# Altium footprint library hallglib.PcbLib: 88 footprints (part 4 of 6)
Each footprint in its own frame and in the unit in brackets; x right, y up, seen from the top. Pads: shape width x height; smd on the part's side, far side on the other; paste and mask are expansions set on the pad; w line width, h text height; cw(c..) or ccw(c..) is an arc to the next point about the centre after c.
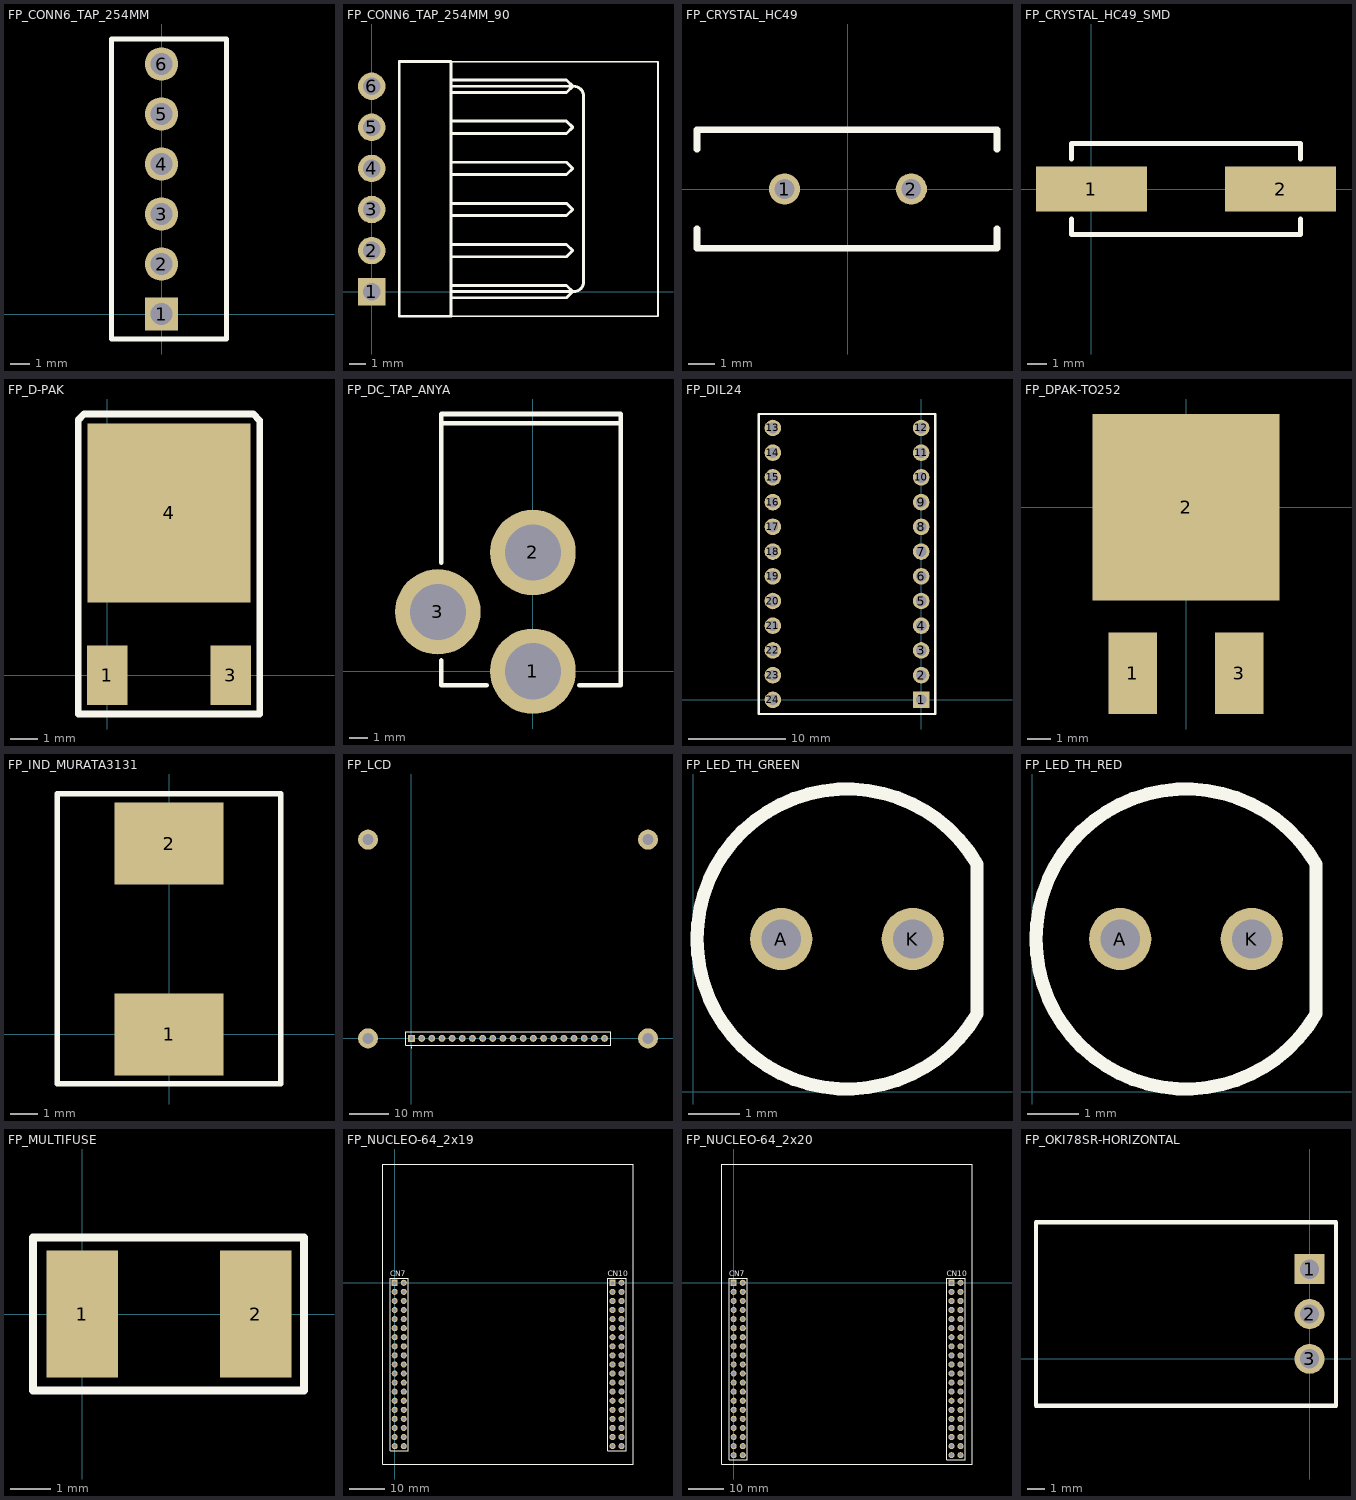
[diagram p3: the footprints below, top view; thin cyan lines are the x and y axes]

## FP_CONN6_TAP_254MM [mm] "álló hat pólusú tápcsatlakozó 2.54mm"
height 6.3
pads (6):
  rect 1.7x1.7 hole 1.1: 1(0,0)
  round 1.7 hole 1.1: 2(0,2.54) 3(0,5.08) 4(0,7.62) 5(0,10.16) 6(0,12.7)
Top Overlay:
  lines w0.254: -2.54,-1.27 3.302,-1.27 3.302,13.97 -2.54,13.97 -2.54,-1.27
3D body "Cvilux_CI31_6.step": height 11.56, standoff -3.24, extent -2.521,-1.27 3.279,13.97

## FP_CONN6_TAP_254MM_90 [mm] "fekvő hat pólusú tápcsatlakozó 2.54mm"
height 6.3
pads (6):
  rect 1.7x1.7 hole 1.1: 1(0,0)
  round 1.7 hole 1.1: 2(0,2.54) 3(0,5.08) 4(0,7.62) 5(0,10.16) 6(0,12.7)
Top Overlay:
  lines w0.102: 4.9,-1.53 17.7,-1.53 17.7,14.224 4.9,14.224
  lines w0.178: 4.9,0 12.5,0 ccw(c12.5,0.6) 13.1,0.6 13.1,12.065 ; 4.9,12.7 12.5,12.7 cw(c12.5,12.1) 13.1,12.1 ; 4.934,-0.381 12.046,-0.381 12.427,0 12.046,0.381 4.934,0.381 ; 4.934,2.159 12.046,2.159 12.427,2.54 12.046,2.921 4.934,2.921 ; 4.934,4.699 12.046,4.699 12.427,5.08 12.046,5.461 4.934,5.461 ; 4.934,7.239 12.046,7.239 12.427,7.62 12.046,8.001 4.934,8.001 ; 4.934,9.779 12.046,9.779 12.427,10.16 12.046,10.541 4.934,10.541 ; 4.934,12.319 12.046,12.319 12.427,12.7 12.046,13.081 4.934,13.081 ; 1.7,-1.524 1.7,14.224 4.9,14.224 4.9,-1.524 1.7,-1.524
3D body "254_TAP_4P.STEP": height 5.8, standoff -3.4, extent -0.343,3.785 13.482,13.945
3D body "254_TAP_4P.STEP": height 5.8, standoff -3.4, extent -0.343,-1.295 13.482,8.865

## FP_CRYSTAL_HC49 [mm] "HC49"
height 3.7
pads (2):
  round 1.2 hole 0.762: 1(-2.44,0) 2(2.44,0)
Top Overlay:
  lines w0.254: -5.816,-1.524 -5.816,-2.286 5.741,-2.286 5.741,-1.524 ; -5.816,1.524 -5.816,2.286 5.741,2.286 5.741,1.524
3D body "SW3dPS-HP49US.STEP": height 3.5, standoff -4, extent -5.675,-2.35 5.675,2.3

## FP_CRYSTAL_HC49_SMD [mil] "HC49/SMD"
height 118.11
pads (2):
  rect 220x90 smd: 1(0,0) 2(375,0)
Top Overlay:
  lines w10: -40,-60 -40,-90 415,-90 415,-60 ; -40,60 -40,90 415,90 415,60
3D body: height 5, standoff 0, extent 415,-20 432,20
3D body: height 5, standoff 0, extent -57,-20 -40,20
3D body: height 10, standoff 0, extent -40,-90 415,90
3D body: height 130, standoff 10, extent -25,-80 400,80

## FP_D-PAK [mm] "D-Pak (TO-252-AA)"
height 2.39
pads (3):
  rect 1.5x2.2 smd: 1(0,0) 3(4.572,0)
  rect 6x6.6 smd: 4(2.286,6)
Top Overlay:
  lines w0.254: -1.064,-1.425 5.636,-1.425 5.636,9.414 5.4,9.65 -0.85,9.65 -1.064,9.436 -1.064,-1.425
3D body "D-PAK_TO252AA.STEP": height 2.32, standoff 0.02, extent -0.992,-0.786 5.588,8.914

## FP_DC_TAP_ANYA [mil] "DC HEBA25 TÁPFESZÜLTSÉG ALJZAT ZÁRT, NYÁKBA 90°"
height 421.26
pads (3):
  round 180 hole 118: 1(0,0) 2(0,250) 3(-200,125)
Top Overlay:
  lines w10: -192.91,22.64 -192.91,-29.53 -97.44,-29.53 ; -192.91,228.35 -192.91,541.34 185.04,541.34 185.04,-29.53 97.44,-29.53 ; -192.91,522.13 185.04,522.13
3D body "kycon kld-0202-a.step": height 440, standoff -141.73, extent -190.39,-30.63 182.52,539.37

## FP_DIL24 [mm] "DIL24"
height 8.54
pads (24):
  rect 1.7x1.7 hole 1.1: 1(0,0)
  round 1.7 hole 1.1: 2(0,2.54) 3(0,5.08) 4(0,7.62) 5(0,10.16) 6(0,12.7) 7(0,15.24) 8(0,17.78) 9(0,20.32) 10(0,22.86) 11(0,25.4) 12(0,27.94) 13(-15.24,27.94) 14(-15.24,25.4) 15(-15.24,22.86) 16(-15.24,20.32) 17(-15.24,17.78) 18(-15.24,15.24) 19(-15.24,12.7) 20(-15.24,10.16) 21(-15.24,7.62) 22(-15.24,5.08) 23(-15.24,2.54) 24(-15.24,0)
Top Overlay:
  lines w0.254: -16.7,-1.45 1.45,-1.45 1.45,29.375 -16.7,29.375 -16.7,-1.45
3D body: height 2.54, standoff 0, extent -16.52,3.81 -13.98,8.89
3D body: height 0, standoff -3, extent -15.58,4.75 -14.92,5.41
3D body: height 0, standoff -3, extent -15.58,7.29 -14.92,7.95
3D body: height 0, standoff -3, extent -15.58,2.21 -14.92,2.87
3D body: height 0, standoff -3, extent -15.58,-0.33 -14.92,0.33
3D body: height 2.54, standoff 0, extent -16.52,-1.27 -13.98,3.81
3D body: height 0, standoff -3, extent -15.58,12.385 -14.92,13.045
3D body: height 0, standoff -3, extent -15.58,9.845 -14.92,10.505
3D body: height 2.54, standoff 0, extent -16.52,8.905 -13.98,13.985
3D body: height 0, standoff -3, extent -15.58,17.46 -14.92,18.12
3D body: height 0, standoff -3, extent -15.58,14.92 -14.92,15.58
3D body: height 2.54, standoff 0, extent -16.52,13.98 -13.98,19.06
3D body: height 0, standoff -3, extent -15.58,22.535 -14.92,23.195
3D body: height 0, standoff -3, extent -15.58,19.995 -14.92,20.655
3D body: height 2.54, standoff 0, extent -16.52,19.055 -13.98,24.135
3D body: height 0, standoff -3, extent -15.58,27.61 -14.92,28.27
3D body: height 0, standoff -3, extent -15.58,25.07 -14.92,25.73
3D body: height 2.54, standoff 0, extent -16.52,24.13 -13.98,29.21
3D body: height 2.54, standoff 0, extent -1.27,24.13 1.27,29.21
3D body: height 0, standoff -3, extent -0.33,25.07 0.33,25.73
3D body: height 0, standoff -3, extent -0.33,27.61 0.33,28.27
3D body: height 2.54, standoff 0, extent -1.27,19.055 1.27,24.135
3D body: height 0, standoff -3, extent -0.33,19.995 0.33,20.655
3D body: height 0, standoff -3, extent -0.33,22.535 0.33,23.195
3D body: height 2.54, standoff 0, extent -1.27,13.98 1.27,19.06
3D body: height 0, standoff -3, extent -0.33,14.92 0.33,15.58
3D body: height 0, standoff -3, extent -0.33,17.46 0.33,18.12
3D body: height 2.54, standoff 0, extent -1.27,8.905 1.27,13.985
3D body: height 0, standoff -3, extent -0.33,9.845 0.33,10.505
3D body: height 0, standoff -3, extent -0.33,12.385 0.33,13.045
3D body: height 2.54, standoff 0, extent -1.27,-1.27 1.27,3.81
3D body: height 0, standoff -3, extent -0.33,-0.33 0.33,0.33
3D body: height 0, standoff -3, extent -0.33,2.21 0.33,2.87
3D body: height 0, standoff -3, extent -0.33,7.29 0.33,7.95
3D body: height 0, standoff -3, extent -0.33,4.75 0.33,5.41
3D body: height 2.54, standoff 0, extent -1.27,3.81 1.27,8.89
3D body: height 4, standoff 2.54, extent -16.525,-1.275 1.275,29.2
3D body: height 4.86, standoff 4, extent -9.125,4.25 -6.125,6.75

## FP_DPAK-TO252 [mm] "D-PAK Package"
height 2.18
pads (3):
  rect 2.08x3.5 smd: 1(-2.286,-7.112) 3(2.286,-7.112)
  rect 8x8 smd: 2(0,0)
3D body "DPAK_TO-252AA.STEP": height 2.37, standoff -0.03, extent -3.367,-7.112 3.367,2.988

## FP_IND_MURATA3131 [mm] "Murata Chip Inductor LQH88P Series (3131 Size)"
height 4
pads (2):
  rect 4x3 smd: 1(0,0) 2(0,7)
Top Overlay:
  lines w0.2: -4.1,-1.8 -4.1,8.825 4.1,8.825 4.1,-1.8 -4.1,-1.8
3D body: height 1, standoff 0, extent -4,-0.5 4,7.6
3D body: height 3.8, standoff 2.8, extent -4,-0.5 4,7.6
3D body: height 2.8, standoff 1, extent -3.572,-0.043 3.6,7.143
3D body: height 0.3, standoff 0, extent -1.4,-0.55 1.4,-0.5
3D body: height 0.3, standoff 0, extent -1.4,7.6 1.4,7.65

## FP_LCD [mm]
pads (24):
  rect 1.7x1.7 hole 1.1: 1(0,0)
  round 1.7 hole 1.1: 2(2.54,0) 3(5.08,0) 4(7.62,0) 5(10.16,0) 6(12.7,0) 7(15.24,0) 8(17.78,0) 9(20.32,0) 10(22.86,0) 11(25.4,0) 12(27.94,0) 13(30.48,0) 14(33.02,0) 15(35.56,0) 16(38.1,0) 17(40.64,0) 18(43.18,0) 19(45.72,0) 20(48.26,0)
  round 5 hole 2.8: ""(-10.87,0) ""(-10.87,49.7) ""(59.13,0) ""(59.13,49.7)
Top Overlay:
  circle w0.3: c0,-2.3 r0.1
  lines w0.254: -1.47,-1.7 49.8,-1.7 49.8,1.67 -1.47,1.67 -1.47,-1.7
3D body: height 8.5, standoff 0, extent -1.3,-1.3 49.6,1.3
3D body: height 0, standoff -3, extent -0.33,-0.33 0.33,0.33
3D body: height 0, standoff -3, extent 2.21,-0.33 2.87,0.33
3D body: height 0, standoff -3, extent 4.75,-0.33 5.41,0.33
3D body: height -9.86, standoff -12.4, extent 24.13,-1.27 29.21,1.27
3D body: height 0, standoff -3, extent 27.61,-0.33 28.27,0.33
3D body: height -9.86, standoff -12.4, extent -1.27,-1.27 3.81,1.27
3D body: height -9.86, standoff -12.4, extent 3.81,-1.27 8.89,1.27
3D body: height -9.86, standoff -12.4, extent 8.89,-1.27 13.97,1.27
3D body: height -9.86, standoff -12.4, extent 13.97,-1.27 19.05,1.27
3D body: height -9.86, standoff -12.4, extent 19.05,-1.27 24.13,1.27
3D body: height -9.86, standoff -12.4, extent 29.21,-1.27 34.29,1.27
3D body: height -9.86, standoff -12.4, extent 34.29,-1.27 39.37,1.27
3D body: height -9.86, standoff -12.4, extent 39.37,-1.27 44.45,1.27
3D body: height -9.86, standoff -12.4, extent 44.45,-1.27 49.53,1.27
3D body: height 0, standoff -3, extent 42.85,-0.331 43.511,0.33
3D body: height 0, standoff -3, extent 45.39,-0.331 46.051,0.33
3D body: height 0, standoff -3, extent 47.93,-0.331 48.591,0.33
3D body: height 0, standoff -3, extent 40.31,-0.331 40.971,0.33
3D body: height 0, standoff -3, extent 37.77,-0.331 38.431,0.33
3D body: height 0, standoff -3, extent 35.23,-0.331 35.891,0.33
3D body: height 0, standoff -3, extent 32.69,-0.33 33.35,0.33
3D body: height 0, standoff -3, extent 30.15,-0.33 30.81,0.33
3D body: height 0, standoff -3, extent 25.07,-0.33 25.73,0.33
3D body: height -3.46, standoff -13.46, extent 25.07,-0.33 25.73,0.33
3D body: height -3.46, standoff -13.46, extent 27.61,-0.33 28.27,0.33
3D body: height -3.46, standoff -13.46, extent 30.15,-0.33 30.81,0.33
3D body: height -3.46, standoff -13.46, extent 32.69,-0.33 33.35,0.33
3D body: height -3.46, standoff -13.46, extent 35.23,-0.331 35.891,0.33
3D body: height -3.46, standoff -13.46, extent 37.77,-0.331 38.431,0.33
3D body: height -3.46, standoff -13.46, extent 40.31,-0.331 40.971,0.33
3D body: height -3.46, standoff -13.46, extent 42.85,-0.331 43.511,0.33
3D body: height -3.46, standoff -13.46, extent 45.39,-0.331 46.051,0.33
3D body: height -3.46, standoff -13.46, extent 47.93,-0.331 48.591,0.33
3D body: height 0, standoff -3, extent 22.53,-0.33 23.19,0.33
3D body: height -3.46, standoff -13.46, extent 22.53,-0.33 23.19,0.33
3D body: height -3.46, standoff -13.46, extent 19.99,-0.33 20.65,0.33
3D body: height 0, standoff -3, extent 19.99,-0.33 20.65,0.33
3D body: height 0, standoff -3, extent 17.45,-0.33 18.11,0.33
3D body: height -3.46, standoff -13.46, extent 17.45,-0.33 18.11,0.33
3D body: height 0, standoff -3, extent 14.91,-0.33 15.57,0.33
3D body: height -3.46, standoff -13.46, extent 14.91,-0.33 15.57,0.33
3D body: height 0, standoff -3, extent 12.37,-0.33 13.03,0.33
3D body: height -3.46, standoff -13.46, extent 12.37,-0.33 13.03,0.33
3D body: height -3.46, standoff -13.46, extent 9.83,-0.33 10.49,0.33
3D body: height 0, standoff -3, extent 9.83,-0.33 10.49,0.33
3D body: height 0, standoff -3, extent 7.29,-0.33 7.95,0.33
3D body: height -3.46, standoff -13.46, extent 7.29,-0.33 7.95,0.33
3D body: height -3.46, standoff -13.46, extent 4.75,-0.33 5.41,0.33
3D body: height -3.46, standoff -13.46, extent 2.21,-0.33 2.87,0.33
3D body: height -3.46, standoff -13.46, extent -0.33,-0.33 0.33,0.33
3D body: height 17.5, standoff 12.2, extent -11.17,2.7 59.43,47.3
3D body: height 12.2, standoff 12, extent -13.37,-3 61.63,50
3D body: height 17.6, standoff 17.3, extent -5.27,7.8 53.53,39.2
3D body: height 12, standoff 0, extent 56.63,-2.497 61.63,2.497
3D body: height 12, standoff 0, extent -13.37,47.203 -8.37,52.197
3D body: height 12, standoff 0, extent 56.63,47.203 61.63,52.197
3D body: height 12, standoff 0, extent -13.37,-2.497 -8.37,2.497

## FP_LED_TH_GREEN [mm]
pads (2):
  round 1.2 hole 0.762: A(1.7,2.95) K(4.24,2.95)
Top Overlay:
  lines w0.254: 5.478,1.502 cw(c2.97,2.95) 5.478,4.398 5.478,1.502
3D body "corto_green.step": height 10.25, standoff -5, extent 0,0 5.45,5.9

## FP_LED_TH_RED [mm]
pads (2):
  round 1.2 hole 0.762: A(1.7,2.95) K(4.24,2.95)
Top Overlay:
  lines w0.254: 5.478,1.502 cw(c2.97,2.95) 5.478,4.398 5.478,1.502
3D body "corto_red.step": height 10.25, standoff -5, extent 0,0 5.45,5.9

## FP_MULTIFUSE [mm] "POLYFUSE SMD 1812"
height 1
pads (2):
  rect 1.78x3.15 smd: 1(0,0) 2(4.318,0)
Top Overlay:
  lines w0.2: -1.225,-1.9 -1.225,1.9 5.525,1.9 5.525,-1.9 -1.225,-1.9
3D body: height 1, standoff 0, extent -0.124,-1.714 4.574,1.714

## FP_NUCLEO-64_2x19 [mm]
height 11
pads (76):
  rect 1.7x1.7 hole 1.1: 1(0,0) 39(60.96,0)
  round 1.7 hole 1.1: 2(2.54,0) 3(0,-2.54) 4(2.54,-2.54) 5(0,-5.08) 6(2.54,-5.08) 7(0,-7.62) 8(2.54,-7.62) 9(0,-10.16) 10(2.54,-10.16) 11(0,-12.7) 12(2.54,-12.7) 13(0,-15.24) 14(2.54,-15.24) 15(0,-17.78) 16(2.54,-17.78) 17(0,-20.32) 18(2.54,-20.32) 19(0,-22.86) 20(2.54,-22.86) 21(0,-25.4) 22(2.54,-25.4) 23(0,-27.94) 24(2.54,-27.94) 25(0,-30.48) 26(2.54,-30.48) 27(0,-33.02) 28(2.54,-33.02) 29(0,-35.56) 30(2.54,-35.56) 31(0,-38.1) 32(2.54,-38.1) 33(0,-40.64) 34(2.54,-40.64) 35(0,-43.18) 36(2.54,-43.18) 37(0,-45.72) 38(2.54,-45.72) 40(63.5,0) 41(60.96,-2.54) 42(63.5,-2.54) 43(60.96,-5.08) 44(63.5,-5.08) 45(60.96,-7.62) 46(63.5,-7.62) 47(60.96,-10.16) 48(63.5,-10.16) 49(60.96,-12.7) 50(63.5,-12.7) 51(60.96,-15.24) 52(63.5,-15.24) 53(60.96,-17.78) 54(63.5,-17.78) 55(60.96,-20.32) 56(63.5,-20.32) 57(60.96,-22.86) 58(63.5,-22.86) 59(60.96,-25.4) 60(63.5,-25.4) 61(60.96,-27.94) 62(63.5,-27.94) 63(60.96,-30.48) 64(63.5,-30.48) 65(60.96,-33.02) 66(63.5,-33.02) 67(60.96,-35.56) 68(63.5,-35.56) 69(60.96,-38.1) 70(63.5,-38.1) 71(60.96,-40.64) 72(63.5,-40.64) 73(60.96,-43.18) 74(63.5,-43.18) 75(60.96,-45.72) 76(63.5,-45.72)
Top Overlay:
  lines w0.2: -1.27,-46.99 -1.27,1.27 3.81,1.27 3.81,-46.99 -1.27,-46.99 ; 59.69,-46.99 59.69,1.27 64.77,1.27 64.77,-46.99 59.69,-46.99
  lines w0.254: -3.3,-50.725 66.725,-50.725 66.725,33.25 -3.3,33.25 -3.3,-50.725
  text "CN7" at -1.27,1.778 h1.52
  text "CN10" at 59.69,1.778 h1.52
3D body: height 11, standoff 10, extent -3.299,-50.724 66.724,33.249
3D body: height 10, standoff 0, extent -1.269,-46.989 3.809,1.269
3D body: height 10, standoff 0, extent 59.691,-46.989 64.769,1.269

## FP_NUCLEO-64_2x20 [mm]
height 11
pads (80):
  round 1.7 hole 1.1: 0(0,-48.26) 0(2.54,-48.26) 0(60.96,-48.26) 0(63.5,-48.26) 2(2.54,0) 3(0,-2.54) 4(2.54,-2.54) 5(0,-5.08) 6(2.54,-5.08) 7(0,-7.62) 8(2.54,-7.62) 9(0,-10.16) 10(2.54,-10.16) 11(0,-12.7) 12(2.54,-12.7) 13(0,-15.24) 14(2.54,-15.24) 15(0,-17.78) 16(2.54,-17.78) 17(0,-20.32) 18(2.54,-20.32) 19(0,-22.86) 20(2.54,-22.86) 21(0,-25.4) 22(2.54,-25.4) 23(0,-27.94) 24(2.54,-27.94) 25(0,-30.48) 26(2.54,-30.48) 27(0,-33.02) 28(2.54,-33.02) 29(0,-35.56) 30(2.54,-35.56) 31(0,-38.1) 32(2.54,-38.1) 33(0,-40.64) 34(2.54,-40.64) 35(0,-43.18) 36(2.54,-43.18) 37(0,-45.72) 38(2.54,-45.72) 40(63.5,0) 41(60.96,-2.54) 42(63.5,-2.54) 43(60.96,-5.08) 44(63.5,-5.08) 45(60.96,-7.62) 46(63.5,-7.62) 47(60.96,-10.16) 48(63.5,-10.16) 49(60.96,-12.7) 50(63.5,-12.7) 51(60.96,-15.24) 52(63.5,-15.24) 53(60.96,-17.78) 54(63.5,-17.78) 55(60.96,-20.32) 56(63.5,-20.32) 57(60.96,-22.86) 58(63.5,-22.86) 59(60.96,-25.4) 60(63.5,-25.4) 61(60.96,-27.94) 62(63.5,-27.94) 63(60.96,-30.48) 64(63.5,-30.48) 65(60.96,-33.02) 66(63.5,-33.02) 67(60.96,-35.56) 68(63.5,-35.56) 69(60.96,-38.1) 70(63.5,-38.1) 71(60.96,-40.64) 72(63.5,-40.64) 73(60.96,-43.18) 74(63.5,-43.18) 75(60.96,-45.72) 76(63.5,-45.72)
  rect 1.7x1.7 hole 1.1: 1(0,0) 39(60.96,0)
Top Overlay:
  lines w0.2: -1.27,-49.53 3.81,-49.53 3.81,1.27 -1.27,1.27 -1.27,-49.53 ; 59.69,-49.53 64.77,-49.53 64.77,1.27 59.69,1.27 59.69,-49.53
  lines w0.254: -3.3,-50.725 -3.3,33.25 66.725,33.25 66.725,-50.725 -3.3,-50.725
  text "CN10" at 59.69,1.778 h1.52
  text "CN7" at -1.27,1.778 h1.52
3D body: height 10, standoff 0, extent 59.691,-49.53 64.769,1.269
3D body: height 10, standoff 0, extent -1.269,-49.53 3.809,1.269
3D body: height 11, standoff 10, extent -3.299,-50.724 66.724,33.249

## FP_OKI78SR-HORIZONTAL [mm] "OKI regulator"
height 8.6
pads (3):
  rect 1.7x1.7 hole 1.1: 1(0,5.08)
  round 1.7 hole 1.1: 2(0,2.54) 3(0,0)
Top Overlay:
  lines w0.254: -15.5,-2.66 1.5,-2.66 1.5,7.74 -15.5,7.74 -15.5,-2.66
3D body "mps_dcdc_oki_78sr_horiz_a.step": height 7.67, standoff -5.26, extent -15.235,-2.621 1.275,7.793